# Altium footprint library PcbLib1.PcbLib: 32 footprints (part 1 of 2)
Each footprint in its own frame and in the unit in brackets; x right, y up, seen from the top. Pads: shape width x height; smd on the part's side, far side on the other; paste and mask are expansions set on the pad; w line width, h text height; cw(c..) or ccw(c..) is an arc to the next point about the centre after c.
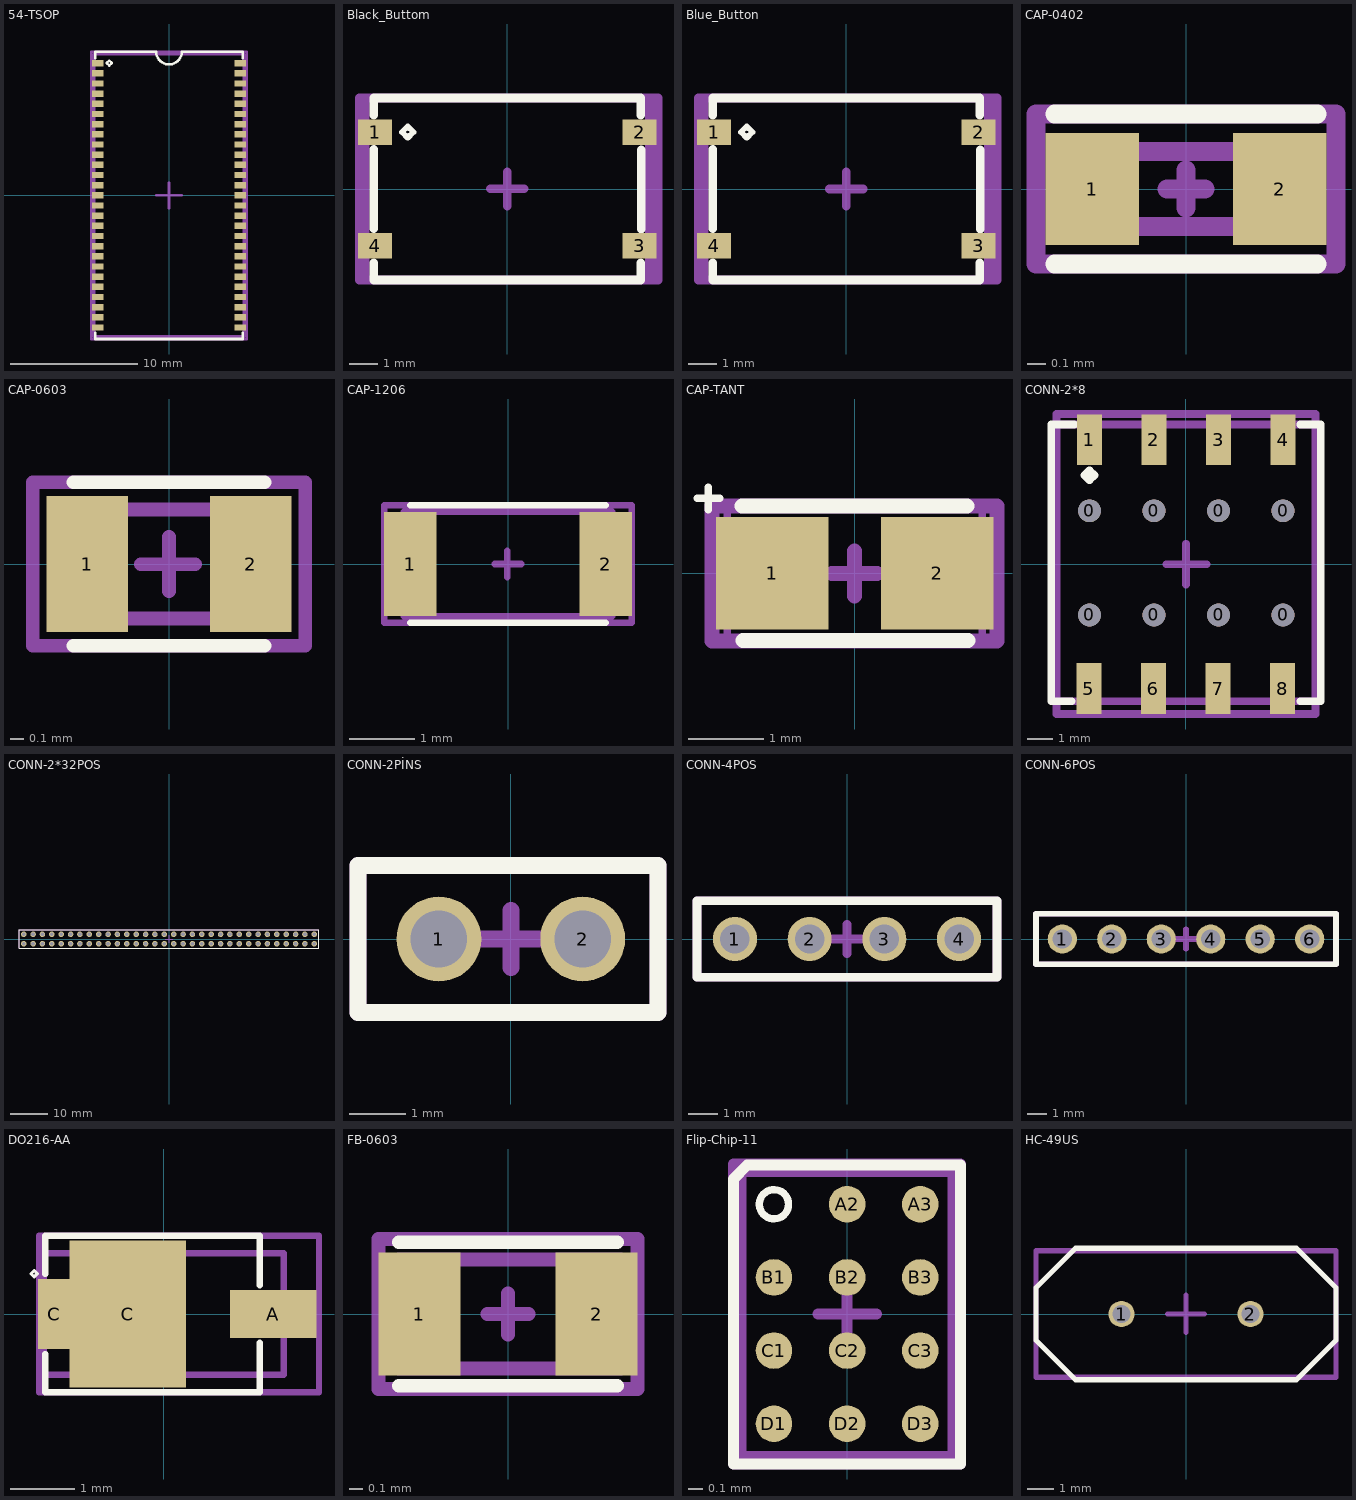
[diagram p0: the footprints below, top view; thin cyan lines are the x and y axes]

## 54-TSOP [mm]
pads (56):
  rect 0.9x0.5 smd mask+0.005: 1(-5.6,10.4) 1(-5.6,10.4) 2(-5.6,9.6) 3(-5.6,8.8) 4(-5.6,8) 5(-5.6,7.2) 6(-5.6,6.4) 7(-5.6,5.6) 8(-5.6,4.8) 9(-5.6,4) 10(-5.6,3.2) 11(-5.6,2.4) 12(-5.6,1.6) 13(-5.6,0.8) 14(-5.6,0) 15(-5.6,-0.8) 16(-5.6,-1.6) 17(-5.6,-2.4) 18(-5.6,-3.2) 19(-5.6,-4) 20(-5.6,-4.8) 21(-5.6,-5.6) 22(-5.6,-6.4) 23(-5.6,-7.2) 24(-5.6,-8) 25(-5.6,-8.8) 26(-5.6,-9.6) 27(-5.6,-10.4) 28(5.6,-10.4) 28(5.6,-10.4) 29(5.6,-9.6) 30(5.6,-8.8) 31(5.6,-8) 32(5.6,-7.2) 33(5.6,-6.4) 34(5.6,-5.6) 35(5.6,-4.8) 36(5.6,-4) 37(5.6,-3.2) 38(5.6,-2.4) 39(5.6,-1.6) 40(5.6,-0.8) 41(5.6,0) 42(5.6,0.8) 43(5.6,1.6) 44(5.6,2.4) 45(5.6,3.2) 46(5.6,4) 47(5.6,4.8) 48(5.6,5.6) 49(5.6,6.4) 50(5.6,7.2) 51(5.6,8) 52(5.6,8.8) 53(5.6,9.6) 54(5.6,10.4)
Top Overlay:
  lines w0.2: -5.8,-10.8 -5.8,-11.3 5.8,-11.3 5.8,-10.8 ; -5.8,10.8 -5.8,11.3 -1,11.3 ccw(c0,11.3) 1,11.3 5.8,11.3 5.8,10.8 ; -4.9,10.4 -4.7,10.2 -4.5,10.4 -4.7,10.6 -4.9,10.4
Top Compenent Center:
  lines w0.2: -1,0 1,0 ; 0,-1 0,1 ; -6.1,-11.3 6.1,-11.3 6.1,11.3 -6.1,11.3 -6.1,-11.3
Top 3D Body:
  lines w0.2: -5.9,-11.1 5.9,-11.1 5.9,11.1 -5.9,11.1 -5.9,-11.1
Top Designator:
  lines w0.2: -6.1,-11.3 6.1,-11.3 6.1,11.3 -6.1,11.3 -6.1,-11.3
  text ".Designator" at -5.246,9.287 h1
3D body "IS42S16400J-7TL.step": height 1.2, standoff 0, extent -5.88,-11.11 5.88,11.11

## Black_Buttom [mm]
pads (4):
  rect 1.2x0.9 smd mask+0.005: 1(-4.65,2) 2(4.65,2) 3(4.65,-2) 4(-4.65,-2)
Top Overlay:
  lines w0.2: -3.7,2 -3.5,1.8 -3.3,2 -3.5,2.2 -3.7,2
  lines w0.3: -4.7,-2.6 -4.7,-3.2 4.7,-3.2 4.7,-2.6 ; -4.7,-1.4 -4.7,1.4 ; -4.7,2.6 -4.7,3.2 4.7,3.2 4.7,2.6 ; 4.705,-1.417 4.705,1.383
Top Compenent Center:
  lines w0.3: -0.604,0.008 0.596,0.008 ; 0,-0.6 0,0.6 ; -5.2,-3.2 5.3,-3.2 5.3,3.2 -5.2,3.2 -5.2,-3.2
Top 3D Body:
  lines w0.3: -5,-3.2 5,-3.2 5,3.2 -5,3.2 -5,-3.2
Top Designator:
  lines w0.3: -5.2,-3.2 -5.2,3.2 5.3,3.2 5.3,-3.2 -5.2,-3.2
  text ".Designator" at -4.746,-0.113 h1
3D body "KSC321GLFS-black.stp": height 3.46, standoff 0, extent -5.025,-3.15 4.975,3.15

## Blue_Button [mm]
pads (4):
  rect 1.2x0.9 smd mask+0.005: 1(-4.65,2) 2(4.65,2) 3(4.65,-2) 4(-4.65,-2)
Top Overlay:
  lines w0.2: -3.7,2 -3.5,2.2 -3.3,2 -3.5,1.8 -3.7,2
  lines w0.3: -4.7,-2.6 -4.7,-3.2 4.7,-3.2 4.7,-2.6 ; -4.7,-1.4 -4.7,1.4 ; -4.7,2.6 -4.7,3.2 4.7,3.2 4.7,2.6 ; 4.705,-1.417 4.705,1.383
Top Compenent Center:
  lines w0.3: -0.6,0 0.6,0 ; 0,-0.6 0,0.6 ; -5.2,-3.2 -5.2,3.2 5.3,3.2 5.3,-3.2 -5.2,-3.2
Top 3D Body:
  lines w0.3: -5,-3.2 -5,3.2 5,3.2 5,-3.2 -5,-3.2
Top Designator:
  lines w0.3: -5.2,-3.2 -5.2,3.2 5.3,3.2 5.3,-3.2 -5.2,-3.2
  text ".Designator" at -4.546,-0.513 h1
3D body "KSC721GLFS_blue.stp": height 4.4, standoff 0, extent -5,-3.15 5,3.15

## CAP-0402 [mm]
pads (2):
  rect 0.5x0.6 smd mask+0.005: 1(-0.5,0) 2(0.5,0)
Top Overlay:
  lines w0.1: -0.7,-0.4 0.7,-0.4 ; -0.7,0.4 0.7,0.4
Top Compenent Center:
  lines w0.1: -0.102,0 0.102,0 ; 0,-0.102 0,0.102 ; -0.8,-0.4 0.8,-0.4 0.8,0.4 -0.8,0.4 -0.8,-0.4
Top 3D Body:
  lines w0.1: -0.5,-0.2 -0.5,0.2 0.5,0.2 0.5,-0.2 -0.5,-0.2
Top Designator:
  lines w0.1: -0.8,-0.4 -0.8,0.4 0.8,0.4 0.8,-0.4 -0.8,-0.4
  text ".Designator" at -3.096,0.787 h1
3D body "CC0402JRNPO9BN200.step": height 0.55, standoff 0, extent -0.5,-0.25 0.5,0.25

## CAP-0603 [mm]
pads (2):
  rect 0.6x1 smd mask+0.005: 1(-0.6,0) 2(0.6,0)
Top Overlay:
  lines w0.1: -0.7,-0.6 0.7,-0.6 ; -0.7,0.6 0.7,0.6
Top Compenent Center:
  lines w0.1: -0.208,-0.003 0.192,-0.003 ; 0,-0.2 0,0.2 ; -1,-0.6 -1,0.6 1,0.6 1,-0.6 -1,-0.6
Top 3D Body:
  lines w0.1: -0.8,-0.4 -0.8,0.4 0.8,0.4 0.8,-0.4 -0.8,-0.4
Top Designator:
  lines w0.1: -1,-0.6 -1,0.6 1,0.6 1,-0.6 -1,-0.6
  text ".Designator" at -2.046,-0.513 h1
3D body "CC0603KRX5R7BB105.step": height 0.9, standoff 0, extent -0.8,-0.4 0.8,0.4

## CAP-1206 [mm]
pads (2):
  rect 0.8x1.6 smd mask+0.005: 1(-1.5,0) 2(1.5,0)
Top Overlay:
  lines w0.1: -1.5,-0.9 1.5,-0.9 ; -1.5,0.9 1.5,0.9
Top Compenent Center:
  lines w0.1: -0.2,0 0.2,0 ; -0.008,-0.201 -0.008,0.199 ; -1.9,-0.9 -1.9,0.9 1.9,0.9 1.9,-0.9 -1.9,-0.9
Top 3D Body:
  lines w0.1: -1.6,-0.8 -1.6,0.8 1.6,0.8 1.6,-0.8 -1.6,-0.8
Top Designator:
  lines w0.1: -1.9,-0.9 1.9,-0.9 1.9,0.9 -1.9,0.9 -1.9,-0.9
  text ".Designator" at -4.246,1.287 h1
3D body "CC1206KKX7R7BB225.STEP": height 1.45, standoff 0, extent -1.6,-0.8 1.6,0.8

## CAP-TANT [mm]
pads (2):
  rect 1.5x1.5 smd mask+0.005: 1(-1.1,0) 2(1.1,0)
Top Overlay:
  lines w0.1: -2.1,1 -1.8,1 ; -1.95,0.85 -1.95,1.15
  lines w0.2: -1.5,0.9 1.5,0.9 ; -1.488,-0.898 1.512,-0.898
Top Compenent Center:
  lines w0.2: -0.3,0 0.3,0 ; 0,-0.3 0,0.3 ; -1.9,-0.9 1.9,-0.9 1.9,0.9 -1.9,0.9 -1.9,-0.9
Top 3D Body:
  lines w0.1: -1.7,-0.9 -1.7,0.9 1.7,0.9 1.7,-0.9 -1.7,-0.9
Top Designator:
  lines w0.2: -1.9,-0.9 -1.9,0.9 1.9,0.9 1.9,-0.9 -1.9,-0.9
  text ".Designator" at -2.246,-0.513 h1
3D body "TAJA_AVX.step": height 1.85, standoff 0, extent -1.702,-0.902 1.702,0.902

## CONN-2*8 [mm]
pads (16):
  round 0.9 hole 0.9 mask+0.005: 0(-3.8,-2) 0(-3.8,2.1) 0(-1.26,-2) 0(-1.26,2.1) 0(1.28,-2) 0(1.28,2.1) 0(3.82,-2) 0(3.82,2.1)
  rect 1x2 smd mask+0.005: 1(-3.8,4.9) 2(-1.26,4.9) 3(1.28,4.9) 4(3.82,4.9) 5(-3.82,-4.9) 6(-1.28,-4.9) 7(1.26,-4.9) 8(3.8,-4.9)
Top Overlay:
  lines w0.3: -4.5,-5.4 -5.3,-5.4 -5.3,5.5 -4.4,5.5 ; 4.5,-5.4 5.3,-5.4 5.3,5.5 4.5,5.5 ; -4,3.5 -3.8,3.3 -3.6,3.5 -3.8,3.7 -4,3.5
Top Compenent Center:
  lines w0.3: -0.78,-0.011 0.82,-0.011 ; 0,-0.8 0,0.8 ; -5.1,-5.889 -5.1,5.911 5.1,5.911 5.1,-5.889 -5.1,-5.889
Top 3D Body:
  lines w0.3: -5.1,-5.4 5.1,-5.4 5.1,5.5 -5.1,5.5 -5.1,-5.4
Top Designator:
  lines w0.3: -5.1,-5.9 5.1,-5.9 5.1,5.9 -5.1,5.9 -5.1,-5.9
  text ".Designator" at -5.046,6.687 h1
3D body "SSM-104-L-DH.stp": height 5.77, standoff 0.05, extent -5.08,-5.425 5.08,5.497

## CONN-2*32POS [mm]
pads (64):
  round 1.5 hole 1 mask+0.005: 1(-39.37,-1.27) 2(-39.37,1.27) 3(-36.83,-1.27) 4(-36.83,1.27) 5(-34.29,-1.27) 6(-34.29,1.27) 7(-31.75,-1.27) 8(-31.75,1.27) 9(-29.21,-1.27) 10(-29.21,1.27) 11(-26.67,-1.27) 12(-26.67,1.27) 13(-24.13,-1.27) 14(-24.13,1.27) 15(-21.59,-1.27) 16(-21.59,1.27) 17(-19.05,-1.27) 18(-19.05,1.27) 19(-16.51,-1.27) 20(-16.51,1.27) 21(-13.97,-1.27) 22(-13.97,1.27) 23(-11.43,-1.27) 24(-11.43,1.27) 25(-8.89,-1.27) 26(-8.89,1.27) 27(-6.35,-1.27) 28(-6.35,1.27) 29(-3.81,-1.27) 30(-3.81,1.27) 31(-1.27,-1.27) 32(-1.27,1.27) 33(1.27,-1.27) 34(1.27,1.27) 35(3.81,-1.27) 36(3.81,1.27) 37(6.35,-1.27) 38(6.35,1.27) 39(8.89,-1.27) 40(8.89,1.27) 41(11.43,-1.27) 42(11.43,1.27) 43(13.97,-1.27) 44(13.97,1.27) 45(16.51,-1.27) 46(16.51,1.27) 47(19.05,-1.27) 48(19.05,1.27) 49(21.59,-1.27) 50(21.59,1.27) 51(24.13,-1.27) 52(24.13,1.27) 53(26.67,-1.27) 54(26.67,1.27) 55(29.21,-1.27) 56(29.21,1.27) 57(31.75,-1.27) 58(31.75,1.27) 59(34.29,-1.27) 60(34.29,1.27) 61(36.83,-1.27) 62(36.83,1.27) 63(39.37,-1.27) 64(39.37,1.27)
Top Overlay:
  lines w0.3: -40.64,-2.54 -40.64,2.54 40.64,2.54 40.64,-2.54 -40.64,-2.54
Top Compenent Center:
  lines w0.3: -1,0 1,0 ; 0,-1 0,1 ; -40.64,-2.54 40.64,-2.54 40.64,2.54 -40.64,2.54 -40.64,-2.54
Top 3D Body:
  lines w0.3: -40.64,-2.54 40.64,-2.54 40.64,2.54 -40.64,2.54 -40.64,-2.54
Top Designator:
  lines w0.3: -40.64,-2.54 40.64,-2.54 40.64,2.54 -40.64,2.54 -40.64,-2.54
  text ".Designator" at -4.746,3.287 h1
3D body "TSW-132-24-T-D.stp": height 9.27, standoff -2.92, extent -40.64,-2.54 40.64,2.54

## CONN-2PİNS [mm]
pads (2):
  round 1.5 hole 1 mask+0.005: 1(-1.27,0) 2(1.27,0)
Top Overlay:
  lines w0.3: -2.7,-1.3 2.6,-1.3 2.6,1.3 -2.7,1.3 -2.7,-1.3
Top Compenent Center:
  lines w0.3: -0.5,0 0.5,0 ; 0,-0.5 0,0.5 ; -2.7,-1.3 2.6,-1.3 2.6,1.3 -2.7,1.3 -2.7,-1.3
Top 3D Body:
  lines w0.3: -2.7,-1.3 2.6,-1.3 2.6,1.3 -2.7,1.3 -2.7,-1.3
Top Designator:
  lines w0.3: -2.7,-1.3 2.6,-1.3 2.6,1.3 -2.7,1.3 -2.7,-1.3
  text ".Designator" at -4.646,1.787 h1
3D body "TSW-102-07-L-S.step": height 8.38, standoff -2.54, extent -2.667,-1.27 2.54,1.27

## CONN-4POS [mm]
pads (4):
  round 1.5 hole 1 mask+0.005: 1(-3.81,0) 2(-1.27,0) 3(1.27,0) 4(3.81,0)
Top Overlay:
  lines w0.3: -5.1,-1.3 -5.1,1.3 5.1,1.3 5.1,-1.3 -5.1,-1.3
Top Compenent Center:
  lines w0.3: -0.5,0 0.5,0 ; 0,-0.5 0,0.5 ; -5.1,-1.3 -5.1,1.3 5.1,1.3 5.1,-1.3 -5.1,-1.3
Top 3D Body:
  lines w0.3: -5.1,-1.3 5.1,-1.3 5.1,1.3 -5.1,1.3 -5.1,-1.3
Top Designator:
  lines w0.3: -5.1,-1.3 -5.1,1.3 5.1,1.3 5.1,-1.3 -5.1,-1.3
  text ".Designator" at -5.146,1.887 h1
3D body "61300411121.stp": height 9.27, standoff -2.27, extent -5.08,-1.27 5.08,1.27

## CONN-6POS [mm]
pads (6):
  round 1.5 hole 1 mask+0.005: 1(-6.35,0) 2(-3.81,0) 3(-1.27,0) 4(1.27,0) 5(3.81,0) 6(6.35,0)
Top Overlay:
  lines w0.3: -7.7,-1.3 -7.7,1.3 7.7,1.3 7.7,-1.3 -7.7,-1.3
Top Compenent Center:
  lines w0.3: -0.5,0 0.5,0 ; 0,-0.5 0,0.5 ; -7.7,-1.3 7.7,-1.3 7.7,1.3 -7.7,1.3 -7.7,-1.3
Top 3D Body:
  lines w0.3: -7.7,-1.3 7.7,-1.3 7.7,1.3 -7.7,1.3 -7.7,-1.3
Top Designator:
  lines w0.3: -7.7,-1.3 -7.7,1.3 7.7,1.3 7.7,-1.3 -7.7,-1.3
  text ".Designator" at -4.846,1.887 h1
3D body "TS-106-G-A-1.stp": height 9.28, standoff -4.18, extent -7.722,-1.27 7.722,1.27

## DO216-AA [mm]
pads (3):
  rect 1.35x0.75 smd mask+0.005: A(1.713,0)
  rect 0.5x1.1 smd mask+0.005: C(-1.712,0)
  rect 1.82x2.3 smd mask+0.005: C(-0.562,0)
Top Overlay:
  lines w0.05: -2.026,0.58 -1.976,0.63 -2.026,0.68 -2.076,0.63 -2.026,0.58 ; -2.026,0.58 -2.026,0.58
  lines w0.1: -1.85,-0.625 -1.85,-1.225 1.5,-1.225 1.5,-0.45 ; -1.85,0.625 -1.85,1.225 1.5,1.225 1.5,0.45
Top Compenent Center:
  lines w0.1: -0.3,0 0.3,0 ; 0,-0.3 0,0.3 ; -1.95,-1.225 -1.95,1.225 2.425,1.225 2.425,-1.225 -1.95,-1.225
Top 3D Body:
  lines w0.1: -1.875,-0.95 -1.875,0.95 1.875,0.95 1.875,-0.95 -1.875,-0.95
Top Designator:
  lines w0.1: -1.95,-1.225 2.425,-1.225 2.425,1.225 -1.95,1.225 -1.95,-1.225
  text ".Designator" at -3.046,1.587 h1
3D body "STPS1L40M.step": height 1.15, standoff 0, extent -1.875,-0.95 1.875,0.95

## FB-0603 [mm]
pads (2):
  rect 0.6x0.9 smd mask+0.005: 1(-0.65,0) 2(0.65,0)
Top Overlay:
  lines w0.1: -0.8,-0.525 0.8,-0.525 ; -0.8,0.525 0.8,0.525
Top Compenent Center:
  lines w0.1: -0.15,0 0.15,0 ; 0,-0.15 0,0.15 ; -0.95,-0.55 0.95,-0.55 0.95,0.55 -0.95,0.55 -0.95,-0.55
Top 3D Body:
  lines w0.1: -0.8,-0.4 0.825,-0.4 0.825,0.4 -0.8,0.4 -0.8,-0.4
Top Designator:
  lines w0.1: -0.95,-0.55 0.95,-0.55 0.95,0.55 -0.95,0.55 -0.95,-0.55
  text ".Designator" at -2.146,0.887 h1
3D body "885012006035.STEP": height 0.8, standoff 0, extent -0.8,-0.4 0.8,0.4

## Flip-Chip-11 [mm]
pads (11):
  round 0.25 smd mask+0.005: A2(0,0.75) A3(0.5,0.75) B1(-0.5,0.25) B2(0,0.25) B3(0.5,0.25) C1(-0.5,-0.25) C2(0,-0.25) C3(0.5,-0.25) D1(-0.5,-0.75) D2(0,-0.75) D3(0.5,-0.75)
Top Overlay:
  circle w0.05: c-0.5,0.75 r0.1
  lines w0.075: -0.777,-1.025 -0.777,0.923 -0.683,1.017 0.775,1.017 0.775,-1.025 -0.777,-1.025
Top Compenent Center:
  lines w0.075: -0.2,0 0.2,0 ; 0,-0.2 0,0.2 ; -0.775,-1.025 0.775,-1.025 0.775,1.025 -0.775,1.025 -0.775,-1.025
Top 3D Body:
  lines w0.075: -0.725,-0.975 0.725,-0.975 0.725,0.975 -0.725,0.975 -0.725,-0.975
Top Designator:
  lines w0.075: -0.775,-1.025 -0.775,1.025 0.775,1.025 0.775,-1.025 -0.775,-1.025
  text ".Designator" at -1.996,1.337 h1
3D body "EMIF02-USB03F2.step": height 0.65, standoff 0, extent -0.72,-0.97 0.72,0.97

## HC-49US [mm]
pads (2):
  round 1 hole 0.7 mask+0.005: 1(-2.45,0) 2(2.45,0)
Top Overlay:
  lines w0.2: -5.7,-1 -4.2,-2.5 4.2,-2.5 5.7,-1 5.7,1 4.2,2.5 -4.2,2.5 -5.7,1 -5.7,-1
Top Compenent Center:
  lines w0.2: -0.7,0 0.7,0 ; 0.001,-0.692 0.001,0.708 ; -5.7,-2.4 5.7,-2.4 5.7,2.4 -5.7,2.4 -5.7,-2.4
Top 3D Body:
  lines w0.2: -5.7,-2.4 5.7,-2.4 5.7,2.4 -5.7,2.4 -5.7,-2.4
Top Designator:
  lines w0.2: -5.7,-2.4 5.7,-2.4 5.7,2.4 -5.7,2.4 -5.7,-2.4
  text ".Designator" at -5.046,2.887 h1
3D body "User Library-HC-49_LT_THT.step": height 4.1, standoff -1.49, extent -5.675,-2.325 5.675,2.325